# Altium footprint library Lib_001.PcbLib: 429 footprints (part 24 of 28)
Each footprint in its own frame and in the unit in brackets; x right, y up, seen from the top. Pads: shape width x height; smd on the part's side, far side on the other; paste and mask are expansions set on the pad; w line width, h text height; cw(c..) or ccw(c..) is an arc to the next point about the centre after c.
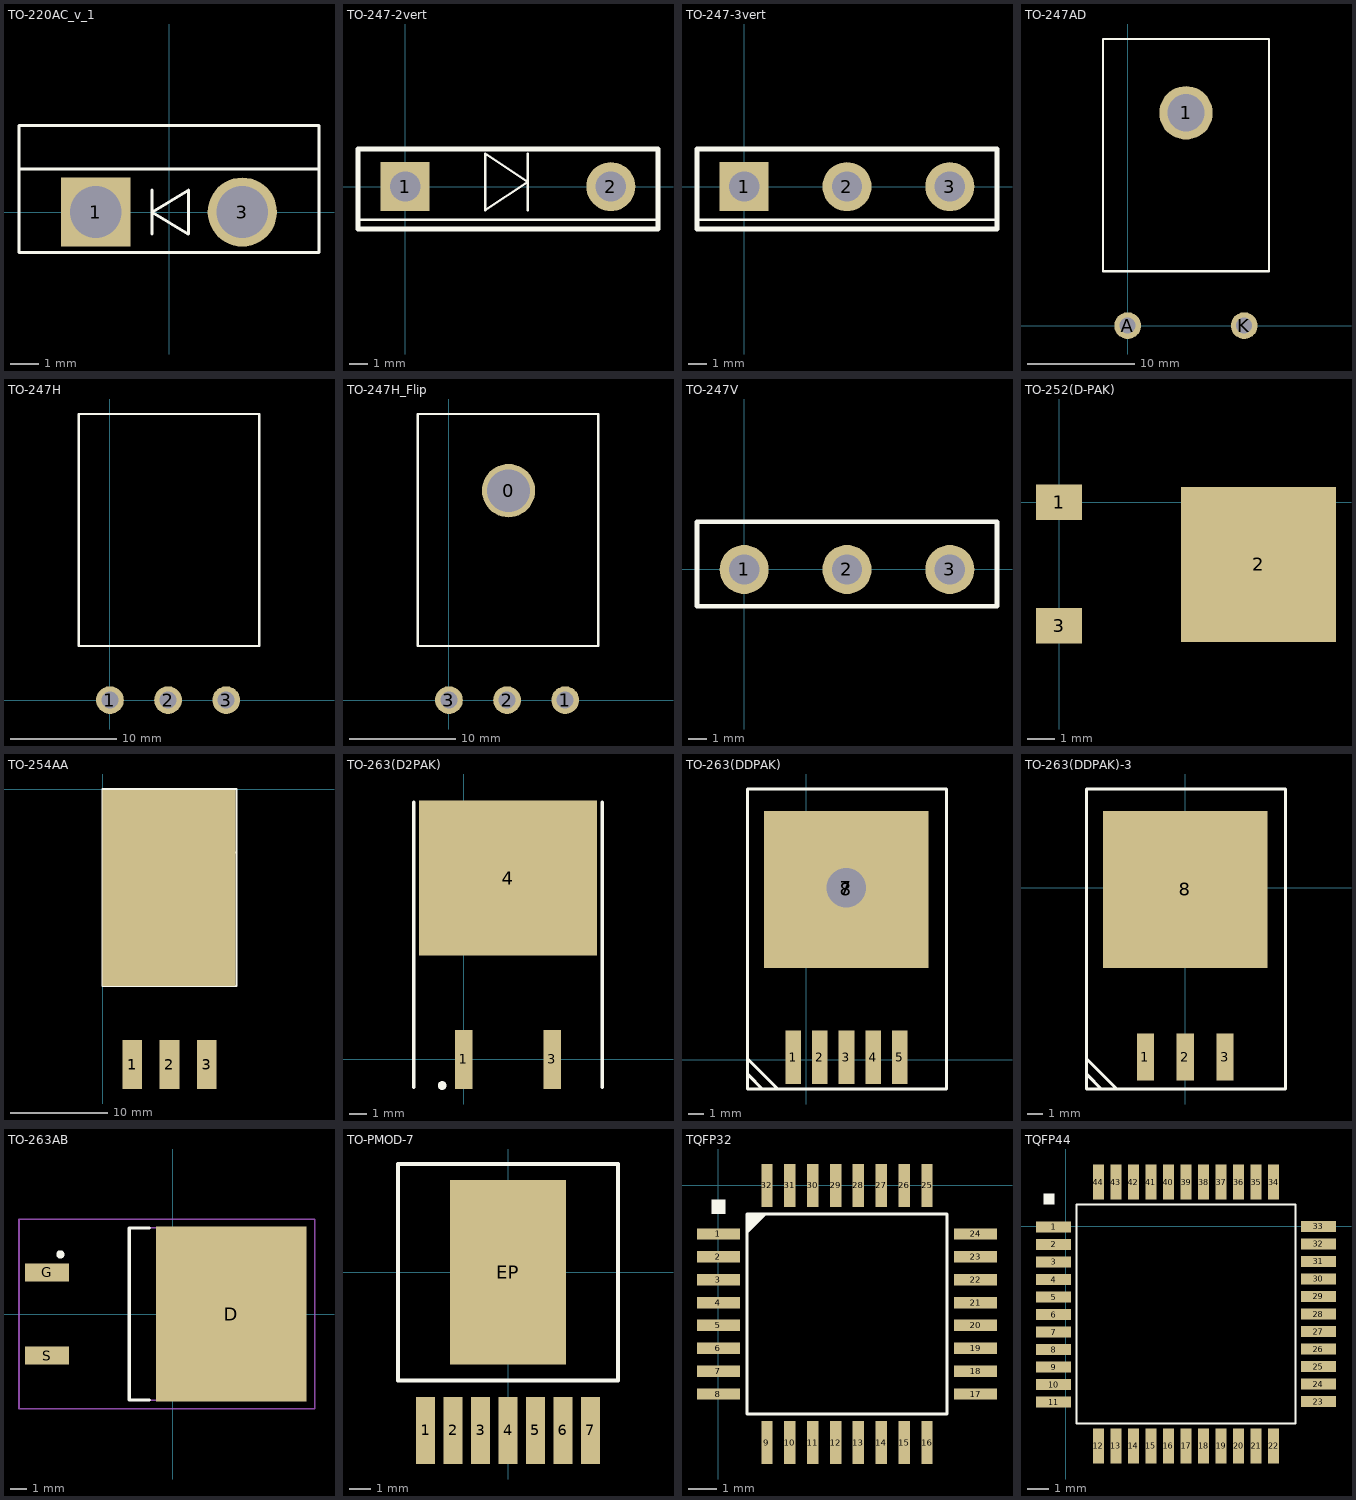
[diagram p23: the footprints below, top view; thin cyan lines are the x and y axes]

## TO-220AC_v_1 [mm]
height 4.7
pads (2):
  rect 2.4x2.4 hole 1.8: 1(-2.54,0)
  round 2.4 hole 1.8: 3(2.54,0)
Top Overlay:
  lines w0.1: -5.2,1.5 5.2,1.5 ; -0.593,-0.762 -0.593,0.762 ; -5.2,-1.4 -5.2,3 5.2,3 5.2,-1.4 -5.2,-1.4 ; -0.593,0 0.677,0.762 0.677,-0.762 -0.593,0
3D body "diodo-to220.stp": height 17, standoff -7, extent -5.2,-1.45 5.2,3.05

## TO-247-2vert [mm]
pads (2):
  rect 2.6x2.6 hole 1.6: 1(0,0)
  round 2.6 hole 1.6: 2(10.9,0)
Top Overlay:
  lines w0.125: -2.5,-1.75 13.4,-1.75 ; 6.5,-1.25 6.5,1.75 ; 4.25,-1.25 6.5,0.25 4.25,1.75 4.25,-1.25
  lines w0.254: -2.5,-2.25 -2.5,0 -2.5,2 0.03,2 13.4,2 13.4,0 13.4,-2.25 0.3,-2.25 -2.5,-2.25
3D body "User Library-TO-247-2_PIN.STEP": height 25.33, standoff -10.73, extent -2.12,-2.311 13.12,2.286

## TO-247-3vert [mm]
pads (3):
  rect 2.6x2.6 hole 1.6: 1(0,0)
  round 2.6 hole 1.6: 2(5.45,0) 3(10.9,0)
Top Overlay:
  lines w0.125: -2.5,-1.75 13.4,-1.75
  lines w0.254: -2.5,-2.25 0.3,-2.25 13.4,-2.25 13.4,0 13.4,2 0.03,2 -2.5,2 -2.5,0 -2.5,-2.25
3D body "SW3dPS-to-247ad.STEP": height 26, standoff -15.07, extent -2.55,-2.515 13.4,2.515

## TO-247AD [mm]
height 5
pads (3):
  round 5 hole 3.5: 1(5.458,19.896)
  round 2.5 hole 1.5: A(0,0) K(10.9,0)
Top Overlay:
  lines w0.203: -2.292,5.08 -2.292,26.81 13.208,26.81 13.208,5.08 -2.292,5.08
3D body "User Library-TO-247AD_bent_leads.STEP": height 5.4, standoff -7.4, extent -2.492,-0.504 13.408,25.396

## TO-247H [mm]
height 5
pads (3):
  round 2.6 hole 1.6: 1(0,0) 2(5.45,0) 3(10.9,0)
Top Overlay:
  lines w0.203: -2.93,5.08 -2.93,26.83 14,26.83 14,5.08 -2.93,5.08
3D body "User Library-TO-247_bent_leads.step": height 6.4, standoff -5.6, extent -2.42,-0.41 13.48,26.572

## TO-247H_Flip [mm]
height 5
pads (4):
  round 5 hole 4: 0(5.588,19.646)
  round 2.6 hole 1.6: 1(10.9,0) 2(5.45,0) 3(0,0)
Top Overlay:
  lines w0.203: -2.93,5.08 -2.93,26.83 14,26.83 14,5.08 -2.93,5.08
3D body "User Library-TO-247H.step": height 5.5, standoff -6.4, extent -2.162,-0.254 13.338,25.146

## TO-247V [mm]
height 5
pads (3):
  round 2.6 hole 1.6: 1(0,0) 2(5.45,0) 3(10.9,0)
Top Overlay:
  lines w0.254: -2.5,-1.95 0,-1.95 13.4,-1.95 13.4,0 13.4,2.53 0,2.53 -2.5,2.53 -2.5,0 -2.5,-1.95
3D body "User Library-TO-247 CASE 340L-02 Vertical.STEP": height 33.55, standoff -7.85, extent -2.55,-2.2 13.45,2.8

## TO-252(D-PAK) [mm]
height 2.3
pads (3):
  rect 1.7x1.3 smd: 1(0,0) 3(0,-4.55)
  rect 5.7x5.7 smd: 2(7.35,-2.29)
3D body "User Library-DPAK-1.step": height 2.44, standoff 0.03, extent -0.261,-5.56 9.678,0.98

## TO-254AA [mm]
height 7
pads (4):
  rect 2x5 smd: 1(3.04,-28.225) 2(6.85,-28.225) 3(10.66,-28.225)
  rect 13.6x20.1 smd: ""(6.8,-10.15)
Top Overlay:
  circle w0.254: c6.85,-3.05 r1.85
  lines w0.203: 0,-6.5 13.7,-6.5 ; 0,-20.2 13.7,-20.2 13.7,0 0,0 0,-20.2

## TO-263(D2PAK) [mm]
pads (3):
  rect 1x3.4 smd: 1(0,0) 3(5.08,0)
  rect 10.25x8.9 smd: 4(2.54,10.45)
Top Overlay:
  circle w0.25: c-1.25,-1.5 r0.125
  lines w0.2: -2.885,-1.6 -2.885,14.8 ; 7.965,-1.6 7.965,14.8
3D body "D2PAK.STEP": height 4.5, standoff 0, extent -2.443,-0.969 7.557,14.031

## TO-263(DDPAK) [mm]
pads (7):
  rect 1x3.4 smd: 1(-0.825,0.178) 2(0.875,0.178) 3(2.575,0.178) 4(4.275,0.178) 5(5.975,0.178)
  round 2.8 hole 2.5: 7(2.565,10.978)
  rect 10.5x10 smd: 8(2.565,10.878)
Top Overlay:
  lines w0.2: -3.734,0.076 -1.836,-1.822 ; -3.694,-0.954 -2.795,-1.853 ; -3.733,-1.852 8.955,-1.852 8.955,17.278 -3.733,17.278 -3.733,-1.852
3D body "SW3dPS-TO263-5.STEP": height 4.68, standoff -0.12, extent -2.4,-0.51 7.6,15.16

## TO-263(DDPAK)-3 [mm]
pads (4):
  rect 1.1x3 smd: 1(-2.54,-10.8) 2(0,-10.8) 3(2.54,-10.8)
  rect 10.5x10 smd: 8(0,-0.1)
Top Overlay:
  lines w0.2: -6.299,-10.902 -4.401,-12.8 ; -6.259,-11.932 -5.36,-12.831 ; -6.298,-12.83 6.39,-12.83 6.39,6.3 -6.298,6.3 -6.298,-12.83
3D body "SW3dPS-TO263-3.STEP": height 5.18, standoff 0.38, extent -5,-11.69 5,3.98

## TO-263AB [mm] "D2-PAK, 4-Leads, Body 8.8x10.4mm, Pitch 2.54mm, Lead Span 15.1mm, IPC Low Density"
height 4.69
pads (3):
  rect 9.2x10.7 smd: D(3.6,0)
  rect 2.7x1.1 smd: G(-7.66,2.54) S(-7.66,-2.54)
Top Overlay:
  circle w0.25: c-6.85,3.64 r0.125
  lines w0.2: -1.4,-5.25 -2.65,-5.25 -2.65,5.25 -1.4,5.25
Mechanical 13:
  lines w0.1: -2.65,-5.275 6.35,-5.275 6.35,5.275 -2.65,5.275 -2.65,-5.275
Mechanical 15:
  lines w0.1: -0.5,0 0.5,0 ; 0,-0.5 0,0.5 ; -9.38,-5.8 8.7,-5.8 8.7,5.8 -9.38,5.8 -9.38,-5.8
3D body "User Library-DPAK.step": height 4.98, standoff -0.03, extent -8.176,-5.07 7.088,5.09

## TO-PMOD-7 [mm]
pads (8):
  rect 0.9x3.1 smd: 1(-3.81,-7.305) 2(-2.54,-7.305) 3(-1.27,-7.305) 4(0,-7.305) 5(1.27,-7.305) 6(2.54,-7.305) 7(3.81,-7.305)
  rect 5.35x8.54 smd: EP(0,0)
Top Overlay:
  lines w0.2: -5.08,-5 -5.08,5 5.08,5 5.08,-5 -5.08,-5
3D body "User Library-TO-PMOD-7-1.STEP": height 4.57, standoff 0, extent -5.13,-8.61 5.03,5.165

## TQFP32 [mm]
pads (32):
  rect 1.5x0.4 smd: 1(0,-1.7) 2(0,-2.5) 3(0,-3.3) 4(0,-4.1) 5(0,-4.9) 6(0,-5.7) 7(0,-6.5) 8(0,-7.3) 17(9,-7.3) 18(9,-6.5) 19(9,-5.7) 20(9,-4.9) 21(9,-4.1) 22(9,-3.3) 23(9,-2.5) 24(9,-1.7)
  rect 0.4x1.5 smd: 9(1.7,-9) 10(2.5,-9) 11(3.3,-9) 12(4.1,-9) 13(4.9,-9) 14(5.7,-9) 15(6.5,-9) 16(7.3,-9) 25(7.3,0) 26(6.5,0) 27(5.7,0) 28(4.9,0) 29(4.1,0) 30(3.3,0) 31(2.5,0) 32(1.7,0)
Top Overlay:
  rectangle: -0.25,-1 0.25,-0.5
  region: 1,-1 1.7,-1 1,-1.7
  lines w0.1: 1,-8 1,-1 8,-1 8,-8 1,-8
3D body "TQFP-32.STEP": height 1.45, standoff -0.01, extent 0.01,-9.01 9.01,-0.01

## TQFP44 [mm]
height 1.2
pads (44):
  rect 1.6x0.5 smd: 1(-0.55,-0.025) 2(-0.55,-0.825) 3(-0.55,-1.625) 4(-0.55,-2.425) 5(-0.55,-3.225) 6(-0.55,-4.025) 7(-0.55,-4.825) 8(-0.55,-5.625) 9(-0.55,-6.425) 10(-0.55,-7.225) 11(-0.55,-8.025) 23(11.55,-8) 24(11.55,-7.2) 25(11.55,-6.4) 26(11.55,-5.6) 27(11.55,-4.8) 28(11.55,-4) 29(11.55,-3.2) 30(11.55,-2.4) 31(11.55,-1.6) 32(11.55,-0.8) 33(11.55,0)
  rect 0.5x1.6 smd: 12(1.5,-10.025) 13(2.3,-10.025) 14(3.1,-10.025) 15(3.9,-10.025) 16(4.7,-10.025) 17(5.5,-10.025) 18(6.3,-10.025) 19(7.1,-10.025) 20(7.9,-10.025) 21(8.7,-10.025) 22(9.5,-10.025) 34(9.5,2.025) 35(8.7,2.025) 36(7.9,2.025) 37(7.1,2.025) 38(6.3,2.025) 39(5.5,2.025) 40(4.7,2.025) 41(3.9,2.025) 42(3.1,2.025) 43(2.3,2.025) 44(1.5,2.025)
Top Overlay:
  rectangle: -1,1 -0.5,1.5
  lines w0.1: 0.5,-9 10.5,-9 10.5,1 0.5,1 0.5,-9
3D body "TQFP44.STEP": height 1.3, standoff 0, extent -0.5,-10 11.5,2